# Altium schematic symbol library Capacitor - Ceramic - Sumsung.SchLib: 1421 symbols (part 1 of 8) (continued)
## CL03C6R2BA3GNNC (continued)
CAP CER 6.2PF 25V NP0 0201; Part Number: CL03C6R2BA3GNNC; Manufacturer: Samsung Electro-Mechanics America, Inc.; TemperatureRange: -55C ~ 125C; TemperatureCoefficient: C0G, NP0; Tolerance: 0.1pF; Value: 6.2pF; PartId: 21075; Supplier 1: Digi-Key; Supplier Part Number 1: 1276-1429-2-ND; ComponentLink1Description: Datasheet; ComponentLink1URL: http://www.samsungsem.com/kr/support/product-search/mlcc/__icsFiles/afieldfile/2016/08/18/S_CL03C6R2BA3GNNC.pdf; ComponentLink2Description: Digi-Key Listing; ComponentLink2URL: https://www.digikey.com/product-detail/en/samsung-electro-mechanics-america-inc/CL03C6R2BA3GNNC/1276-1429-2-ND/3887087; Voltage: 25V; Price: 0.0063; Device Package: 0201 (0603 Metric)
footprint CAP 0201/0603
pins: 1, 2

## CL03C6R8BA3GNNC
designator C?, comment 6.8pF
CAP CER 6.8PF 25V NP0 0201; Part Number: CL03C6R8BA3GNNC; Manufacturer: Samsung Electro-Mechanics America, Inc.; TemperatureRange: -55C ~ 125C; TemperatureCoefficient: C0G, NP0; Tolerance: 0.1pF; Value: 6.8pF; PartId: 20809; Supplier 1: Digi-Key; Supplier Part Number 1: 1276-1430-2-ND; ComponentLink1Description: Datasheet; ComponentLink1URL: //media.digikey.com/pdf/Data%20Sheets/Samsung%20PDFs/CL03C6R8BA3GNNC.pdf; ComponentLink2Description: Digi-Key Listing; ComponentLink2URL: https://www.digikey.com/product-detail/en/samsung-electro-mechanics-america-inc/CL03C6R8BA3GNNC/1276-1430-2-ND/3887088; Voltage: 25V; Price: 0.0107; Device Package: 0201 (0603 Metric)
footprint CAP 0201/0603
pins: 1, 2

## CL03C6R8CA3GNNC
designator C?, comment 6.8pF
CAP CER 6.8PF 25V NP0 0201; Part Number: CL03C6R8CA3GNNC; Manufacturer: Samsung Electro-Mechanics America, Inc.; TemperatureRange: -55C ~ 125C; TemperatureCoefficient: C0G, NP0; Tolerance: 0.25pF; Value: 6.8pF; PartId: 20728; Supplier 1: Digi-Key; Supplier Part Number 1: 1276-1431-2-ND; ComponentLink1Description: Datasheet; ComponentLink1URL: http://www.samsungsem.com/kr/support/product-search/mlcc/__icsFiles/afieldfile/2016/08/18/S_CL03C6R8CA3GNNC.pdf; ComponentLink2Description: Digi-Key Listing; ComponentLink2URL: https://www.digikey.com/product-detail/en/samsung-electro-mechanics-america-inc/CL03C6R8CA3GNNC/1276-1431-2-ND/3887089; Voltage: 25V; Price: 0.0039; Device Package: 0201 (0603 Metric)
footprint CAP 0201/0603
pins: 1, 2

## CL03C7R5BA3GNNC
designator C?, comment 7.5pF
CAP CER 7.5PF 25V NP0 0201; Part Number: CL03C7R5BA3GNNC; Manufacturer: Samsung Electro-Mechanics America, Inc.; TemperatureRange: -55C ~ 125C; TemperatureCoefficient: C0G, NP0; Tolerance: 0.1pF; Value: 7.5pF; PartId: 21070; Supplier 1: Digi-Key; Supplier Part Number 1: 1276-1432-2-ND; ComponentLink1Description: Datasheet; ComponentLink1URL: http://www.samsungsem.com/kr/support/product-search/mlcc/__icsFiles/afieldfile/2016/08/18/S_CL03C7R5BA3GNNC.pdf; ComponentLink2Description: Digi-Key Listing; ComponentLink2URL: https://www.digikey.com/product-detail/en/samsung-electro-mechanics-america-inc/CL03C7R5BA3GNNC/1276-1432-2-ND/3887090; Voltage: 25V; Price: 0.0063; Device Package: 0201 (0603 Metric)
footprint CAP 0201/0603
pins: 1, 2

## CL03C7R5CA3GNNC
designator C?, comment 7.5pF
CAP CER 7.5PF 25V NP0 0201; Part Number: CL03C7R5CA3GNNC; Manufacturer: Samsung Electro-Mechanics America, Inc.; TemperatureRange: -55C ~ 125C; TemperatureCoefficient: C0G, NP0; Tolerance: 0.25pF; Value: 7.5pF; PartId: 21056; Supplier 1: Digi-Key; Supplier Part Number 1: 1276-1433-2-ND; ComponentLink1Description: Datasheet; ComponentLink1URL: http://www.samsungsem.com/kr/support/product-search/mlcc/__icsFiles/afieldfile/2016/08/18/S_CL03C7R5CA3GNNC.pdf; ComponentLink2Description: Digi-Key Listing; ComponentLink2URL: https://www.digikey.com/product-detail/en/samsung-electro-mechanics-america-inc/CL03C7R5CA3GNNC/1276-1433-2-ND/3887091; Voltage: 25V; Price: 0.0039; Device Package: 0201 (0603 Metric)
footprint CAP 0201/0603
pins: 1, 2

## CL03C8R2BA3GNNC
designator C?, comment 8.2pF
CAP CER 8.2PF 25V NP0 0201; Part Number: CL03C8R2BA3GNNC; Manufacturer: Samsung Electro-Mechanics America, Inc.; TemperatureRange: -55C ~ 125C; TemperatureCoefficient: C0G, NP0; Tolerance: 0.1pF; Value: 8.2pF; PartId: 21079; Supplier 1: Digi-Key; Supplier Part Number 1: 1276-1435-2-ND; ComponentLink1Description: Datasheet; ComponentLink1URL: //media.digikey.com/pdf/Data%20Sheets/Samsung%20PDFs/CL03C8R2BA3GNNC.pdf; ComponentLink2Description: Digi-Key Listing; ComponentLink2URL: https://www.digikey.com/product-detail/en/samsung-electro-mechanics-america-inc/CL03C8R2BA3GNNC/1276-1435-2-ND/3887093; Voltage: 25V; Price: 0.0063; Device Package: 0201 (0603 Metric)
footprint CAP 0201/0603
pins: 1, 2

## CL03C8R2CA3GNNC
designator C?, comment 8.2pF
CAP CER 8.2PF 25V NP0 0201; Part Number: CL03C8R2CA3GNNC; Manufacturer: Samsung Electro-Mechanics America, Inc.; TemperatureRange: -55C ~ 125C; TemperatureCoefficient: C0G, NP0; Tolerance: 0.25pF; Value: 8.2pF; PartId: 21072; Supplier 1: Digi-Key; Supplier Part Number 1: 1276-1436-2-ND; ComponentLink1Description: Datasheet; ComponentLink1URL: http://www.samsungsem.com/kr/support/product-search/mlcc/__icsFiles/afieldfile/2016/08/18/S_CL03C8R2CA3GNNC.pdf; ComponentLink2Description: Digi-Key Listing; ComponentLink2URL: https://www.digikey.com/product-detail/en/samsung-electro-mechanics-america-inc/CL03C8R2CA3GNNC/1276-1436-2-ND/3887094; Voltage: 25V; Price: 0.0039; Device Package: 0201 (0603 Metric)
footprint CAP 0201/0603
pins: 1, 2

## CL03C9R1BA3GNNC
designator C?, comment 9.1pF
CAP CER 9.1PF 25V NP0 0201; Part Number: CL03C9R1BA3GNNC; Manufacturer: Samsung Electro-Mechanics America, Inc.; TemperatureRange: -55C ~ 125C; TemperatureCoefficient: C0G, NP0; Tolerance: 0.1pF; Value: 9.1pF; PartId: 21067; Supplier 1: Digi-Key; Supplier Part Number 1: 1276-1437-2-ND; ComponentLink1Description: Datasheet; ComponentLink1URL: //media.digikey.com/pdf/Data%20Sheets/Samsung%20PDFs/CL03C9R1BA3GNNC_Spec.pdf; ComponentLink2Description: Digi-Key Listing; ComponentLink2URL: https://www.digikey.com/product-detail/en/samsung-electro-mechanics-america-inc/CL03C9R1BA3GNNC/1276-1437-2-ND/3887095; Voltage: 25V; Price: 0.0063; Device Package: 0201 (0603 Metric)
footprint CAP 0201/0603
pins: 1, 2

## CL03C9R1CA3GNNC
designator C?, comment 9.1pF
CAP CER 9.1PF 25V NP0 0201; Part Number: CL03C9R1CA3GNNC; Manufacturer: Samsung Electro-Mechanics America, Inc.; TemperatureRange: -55C ~ 125C; TemperatureCoefficient: C0G, NP0; Tolerance: 0.25pF; Value: 9.1pF; PartId: 21048; Supplier 1: Digi-Key; Supplier Part Number 1: 1276-1438-2-ND; ComponentLink1Description: Datasheet; ComponentLink1URL: http://www.samsungsem.com/kr/support/product-search/mlcc/__icsFiles/afieldfile/2016/08/18/S_CL03C9R1CA3GNNC.pdf; ComponentLink2Description: Digi-Key Listing; ComponentLink2URL: https://www.digikey.com/product-detail/en/samsung-electro-mechanics-america-inc/CL03C9R1CA3GNNC/1276-1438-2-ND/3887096; Voltage: 25V; Price: 0.0033; Device Package: 0201 (0603 Metric)
footprint CAP 0201/0603
pins: 1, 2

## CL03C010BA3GNNC
designator C?, comment 1pF
CAP CER 1PF 25V C0G/NP0 0201; Part Number: CL03C010BA3GNNC; Manufacturer: Samsung Electro-Mechanics; TemperatureRange: -55C ~ 125C; TemperatureCoefficient: C0G, NP0; Tolerance: 0.1pF; Value: 1pF; PartId: 30157; Supplier 1: Digi-Key; Supplier Part Number 1: 1276-1361-2-ND; ComponentLink1Description: Datasheet; ComponentLink1URL: http://www.samsungsem.com/kr/support/product-search/mlcc/CL03C010BA3GNNC.jsp; ComponentLink2Description: Digi-Key Listing; ComponentLink2URL: https://www.digikey.com/product-detail/en/samsung-electro-mechanics/CL03C010BA3GNNC/1276-1361-2-ND/3887019; Voltage: 25V; Price: 0; Device Package: 0201 (0603 Metric)
footprint CAP 0201/0603
pins: 1, 2

## CL03C010CA3GNNC
designator C?, comment 1pF
CAP CER 1PF 25V NP0 0201; Part Number: CL03C010CA3GNNC; Manufacturer: Samsung Electro-Mechanics America, Inc.; TemperatureRange: -55C ~ 125C; TemperatureCoefficient: C0G, NP0; Tolerance: 0.25pF; Value: 1pF; PartId: 21030; Supplier 1: Digi-Key; Supplier Part Number 1: 1276-1362-2-ND; ComponentLink1Description: Datasheet; ComponentLink1URL: http://www.samsungsem.com/kr/support/product-search/mlcc/__icsFiles/afieldfile/2016/08/18/S_CL03C010CA3GNNC.pdf; ComponentLink2Description: Digi-Key Listing; ComponentLink2URL: https://www.digikey.com/product-detail/en/samsung-electro-mechanics-america-inc/CL03C010CA3GNNC/1276-1362-2-ND/3887020; Voltage: 25V; Price: 0.0039; Device Package: 0201 (0603 Metric)
footprint CAP 0201/0603
pins: 1, 2

## CL03C020BA3GNNC
designator C?, comment 2pF
CAP CER 2PF 25V NP0 0201; Part Number: CL03C020BA3GNNC; Manufacturer: Samsung Electro-Mechanics America, Inc.; TemperatureRange: -55C ~ 125C; TemperatureCoefficient: C0G, NP0; Tolerance: 0.1pF; Value: 2pF; PartId: 20785; Supplier 1: Digi-Key; Supplier Part Number 1: 1276-1363-2-ND; ComponentLink1Description: Datasheet; ComponentLink1URL: http://www.samsungsem.com/kr/support/product-search/mlcc/__icsFiles/afieldfile/2016/08/18/S_CL03C020BA3GNNC.pdf; ComponentLink2Description: Digi-Key Listing; ComponentLink2URL: https://www.digikey.com/product-detail/en/samsung-electro-mechanics-america-inc/CL03C020BA3GNNC/1276-1363-2-ND/3887021; Voltage: 25V; Price: 0.0063; Device Package: 0201 (0603 Metric)
footprint CAP 0201/0603
pins: 1, 2

## CL03C020CA3GNNC
designator C?, comment 2pF
CAP CER 2PF 25V NP0 0201; Part Number: CL03C020CA3GNNC; Manufacturer: Samsung Electro-Mechanics America, Inc.; TemperatureRange: -55C ~ 125C; TemperatureCoefficient: C0G, NP0; Tolerance: 0.25pF; Value: 2pF; PartId: 21046; Supplier 1: Digi-Key; Supplier Part Number 1: 1276-1364-2-ND; ComponentLink1Description: Datasheet; ComponentLink1URL: http://www.samsungsem.com/kr/support/product-search/mlcc/__icsFiles/afieldfile/2016/08/18/S_CL03C020CA3GNNC.pdf; ComponentLink2Description: Digi-Key Listing; ComponentLink2URL: https://www.digikey.com/product-detail/en/samsung-electro-mechanics-america-inc/CL03C020CA3GNNC/1276-1364-2-ND/3887022; Voltage: 25V; Price: 0.0039; Device Package: 0201 (0603 Metric)
footprint CAP 0201/0603
pins: 1, 2

## CL03C030BA3GNNC
designator C?, comment 3pF
CAP CER 3PF 25V NP0 0201; Part Number: CL03C030BA3GNNC; Manufacturer: Samsung Electro-Mechanics America, Inc.; TemperatureRange: -55C ~ 125C; TemperatureCoefficient: C0G, NP0; Tolerance: 0.1pF; Value: 3pF; PartId: 21058; Supplier 1: Digi-Key; Supplier Part Number 1: 1276-1365-2-ND; ComponentLink1Description: Datasheet; ComponentLink1URL: http://www.samsungsem.com/kr/support/product-search/mlcc/__icsFiles/afieldfile/2016/08/18/S_CL03C030BA3GNNC.pdf; ComponentLink2Description: Digi-Key Listing; ComponentLink2URL: https://www.digikey.com/product-detail/en/samsung-electro-mechanics-america-inc/CL03C030BA3GNNC/1276-1365-2-ND/3887023; Voltage: 25V; Price: 0.0063; Device Package: 0201 (0603 Metric)
footprint CAP 0201/0603
pins: 1, 2

## CL03C030CA3GNNC
designator C?, comment 3pF
CAP CER 3PF 25V NP0 0201; Part Number: CL03C030CA3GNNC; Manufacturer: Samsung Electro-Mechanics America, Inc.; TemperatureRange: -55C ~ 125C; TemperatureCoefficient: C0G, NP0; Tolerance: 0.25pF; Value: 3pF; PartId: 20732; Supplier 1: Digi-Key; Supplier Part Number 1: 1276-1366-2-ND; ComponentLink1Description: Datasheet; ComponentLink1URL: http://www.samsungsem.com/kr/support/product-search/mlcc/__icsFiles/afieldfile/2016/08/18/S_CL03C030CA3GNNC.pdf; ComponentLink2Description: Digi-Key Listing; ComponentLink2URL: https://www.digikey.com/product-detail/en/samsung-electro-mechanics-america-inc/CL03C030CA3GNNC/1276-1366-2-ND/3887024; Voltage: 25V; Price: 0.0039; Device Package: 0201 (0603 Metric)
footprint CAP 0201/0603
pins: 1, 2

## CL03C030CB3GNNC
designator C?, comment 3pF
CAP CER 3PF 50V NP0 0201; Part Number: CL03C030CB3GNNC; Manufacturer: Samsung Electro-Mechanics America, Inc.; TemperatureRange: -55C ~ 125C; TemperatureCoefficient: C0G, NP0; Tolerance: 0.25pF; Value: 3pF; PartId: 20770; Supplier 1: Digi-Key; Supplier Part Number 1: 1276-1367-2-ND; ComponentLink1Description: Datasheet; ComponentLink1URL: http://www.samsungsem.com/kr/support/product-search/mlcc/__icsFiles/afieldfile/2016/08/18/S_CL03C030CB3GNNC.pdf; ComponentLink2Description: Digi-Key Listing; ComponentLink2URL: https://www.digikey.com/product-detail/en/samsung-electro-mechanics-america-inc/CL03C030CB3GNNC/1276-1367-2-ND/3887025; Voltage: 50V; Price: 0.0046; Device Package: 0201 (0603 Metric)
footprint CAP 0201/0603
pins: 1, 2

## CL03C050BA3GNNC
designator C?, comment 5pF
CAP CER 5PF 25V NP0 0201; Part Number: CL03C050BA3GNNC; Manufacturer: Samsung Electro-Mechanics America, Inc.; TemperatureRange: -55C ~ 125C; TemperatureCoefficient: C0G, NP0; Tolerance: 0.1pF; Value: 5pF; PartId: 21033; Supplier 1: Digi-Key; Supplier Part Number 1: 1276-6560-2-ND; ComponentLink1Description: Datasheet; ComponentLink1URL: //media.digikey.com/pdf/Data%20Sheets/Samsung%20PDFs/CL_Series_MLCC_ds.pdf; ComponentLink2Description: Digi-Key Listing; ComponentLink2URL: https://www.digikey.com/product-detail/en/samsung-electro-mechanics-america-inc/CL03C050BA3GNNC/1276-6560-2-ND/5961044; Voltage: 25V; Price: 0.0033; Device Package: 0201 (0603 Metric)
footprint CAP 0201/0603
pins: 1, 2

## CL03C050CA3GNNC
designator C?, comment 5pF
CAP CER 5PF 25V NP0 0201; Part Number: CL03C050CA3GNNC; Manufacturer: Samsung Electro-Mechanics America, Inc.; TemperatureRange: -55C ~ 125C; TemperatureCoefficient: C0G, NP0; Tolerance: 0.25pF; Value: 5pF; PartId: 21059; Supplier 1: Digi-Key; Supplier Part Number 1: 1276-1368-2-ND; ComponentLink1Description: Datasheet; ComponentLink1URL: http://www.samsungsem.com/kr/support/product-search/mlcc/__icsFiles/afieldfile/2016/08/18/S_CL03C050CA3GNNC.pdf; ComponentLink2Description: Digi-Key Listing; ComponentLink2URL: https://www.digikey.com/product-detail/en/samsung-electro-mechanics-america-inc/CL03C050CA3GNNC/1276-1368-2-ND/3887026; Voltage: 25V; Price: 0.0039; Device Package: 0201 (0603 Metric)
footprint CAP 0201/0603
pins: 1, 2

## CL03C060BA3GNNC
designator C?, comment 6pF
CAP CER 6PF 25V NP0 0201; Part Number: CL03C060BA3GNNC; Manufacturer: Samsung Electro-Mechanics America, Inc.; TemperatureRange: -55C ~ 125C; TemperatureCoefficient: C0G, NP0; Tolerance: 0.1pF; Value: 6pF; PartId: 21085; Supplier 1: Digi-Key; Supplier Part Number 1: 1276-1369-2-ND; ComponentLink1Description: Datasheet; ComponentLink1URL: http://www.samsungsem.com/kr/support/product-search/mlcc/__icsFiles/afieldfile/2016/08/18/S_CL03C060BA3GNNC.pdf; ComponentLink2Description: Digi-Key Listing; ComponentLink2URL: https://www.digikey.com/product-detail/en/samsung-electro-mechanics-america-inc/CL03C060BA3GNNC/1276-1369-2-ND/3887027; Voltage: 25V; Price: 0.0063; Device Package: 0201 (0603 Metric)
footprint CAP 0201/0603
pins: 1, 2

## CL03C060CA3GNNC
designator C?, comment 6pF
CAP CER 6PF 25V NP0 0201; Part Number: CL03C060CA3GNNC; Manufacturer: Samsung Electro-Mechanics America, Inc.; TemperatureRange: -55C ~ 125C; TemperatureCoefficient: C0G, NP0; Tolerance: 0.25pF; Value: 6pF; PartId: 21037; Supplier 1: Digi-Key; Supplier Part Number 1: 1276-6710-2-ND; ComponentLink1Description: Datasheet; ComponentLink1URL: http://www.samsungsem.com/kr/support/product-search/mlcc/__icsFiles/afieldfile/2016/08/18/S_CL03C060CA3GNNC.pdf; ComponentLink2Description: Digi-Key Listing; ComponentLink2URL: https://www.digikey.com/product-detail/en/samsung-electro-mechanics-america-inc/CL03C060CA3GNNC/1276-6710-2-ND/5961194; Voltage: 25V; Price: 0.0086; Device Package: 0201 (0603 Metric)
footprint CAP 0201/0603
pins: 1, 2

## CL03C060DA3GNNC
designator C?, comment 6pF
CAP CER 6PF 25V NP0 0201; Part Number: CL03C060DA3GNNC; Manufacturer: Samsung Electro-Mechanics America, Inc.; TemperatureRange: -55C ~ 125C; TemperatureCoefficient: C0G, NP0; Tolerance: 0.5pF; Value: 6pF; PartId: 21043; Supplier 1: Digi-Key; Supplier Part Number 1: 1276-1370-2-ND; ComponentLink1Description: Datasheet; ComponentLink1URL: http://www.samsungsem.com/kr/support/product-search/mlcc/__icsFiles/afieldfile/2016/08/18/S_CL03C060DA3GNNC.pdf; ComponentLink2Description: Digi-Key Listing; ComponentLink2URL: https://www.digikey.com/product-detail/en/samsung-electro-mechanics-america-inc/CL03C060DA3GNNC/1276-1370-2-ND/3887028; Voltage: 25V; Price: 0.0042; Device Package: 0201 (0603 Metric)
footprint CAP 0201/0603
pins: 1, 2

## CL03C070BA3GNNC
designator C?, comment 7pF
CAP CER 7PF 25V NP0 0201; Part Number: CL03C070BA3GNNC; Manufacturer: Samsung Electro-Mechanics America, Inc.; TemperatureRange: -55C ~ 125C; TemperatureCoefficient: C0G, NP0; Tolerance: 0.1pF; Value: 7pF; PartId: 20987; Supplier 1: Digi-Key; Supplier Part Number 1: 1276-6707-2-ND; ComponentLink1Description: Datasheet; ComponentLink1URL: http://www.samsungsem.com/kr/support/product-search/mlcc/__icsFiles/afieldfile/2016/08/18/S_CL03C070BA3GNNC.pdf; ComponentLink2Description: Digi-Key Listing; ComponentLink2URL: https://www.digikey.com/product-detail/en/samsung-electro-mechanics-america-inc/CL03C070BA3GNNC/1276-6707-2-ND/5961191; Voltage: 25V; Price: 0.0033; Device Package: 0201 (0603 Metric)
footprint CAP 0201/0603
pins: 1, 2

## CL03C080DA3GNNC
designator C?, comment 8pF
CAP CER 8PF 25V C0G/NP0 0201; Part Number: CL03C080DA3GNNC; Manufacturer: Samsung Electro-Mechanics; TemperatureRange: -55C ~ 125C; TemperatureCoefficient: C0G, NP0; Tolerance: 0.5pF; Value: 8pF; PartId: 30159; Supplier 1: Digi-Key; Supplier Part Number 1: 1276-1371-2-ND; ComponentLink1Description: Datasheet; ComponentLink1URL: http://www.samsungsem.com/kr/support/product-search/mlcc/CL03C080DA3GNNC.jsp; ComponentLink2Description: Digi-Key Listing; ComponentLink2URL: https://www.digikey.com/product-detail/en/samsung-electro-mechanics/CL03C080DA3GNNC/1276-1371-2-ND/3887029; Voltage: 25V; Price: 0; Device Package: 0201 (0603 Metric)
footprint CAP 0201/0603
pins: 1, 2

## CL03C090CA3GNNC
designator C?, comment 9pF
CAP CER 9PF 25V C0G/NP0 0201; Part Number: CL03C090CA3GNNC; Manufacturer: Samsung Electro-Mechanics; TemperatureRange: -55C ~ 125C; TemperatureCoefficient: C0G, NP0; Tolerance: 0.25pF; Value: 9pF; PartId: 30135; Supplier 1: Digi-Key; Supplier Part Number 1: 1276-1372-2-ND; ComponentLink1Description: Datasheet; ComponentLink1URL: http://www.samsungsem.com/kr/support/product-search/mlcc/CL03C090CA3GNNC.jsp; ComponentLink2Description: Digi-Key Listing; ComponentLink2URL: https://www.digikey.com/product-detail/en/samsung-electro-mechanics/CL03C090CA3GNNC/1276-1372-2-ND/3887030; Voltage: 25V; Price: 0; Device Package: 0201 (0603 Metric)
footprint CAP 0201/0603
pins: 1, 2

## CL03C090DA3GNNC
designator C?, comment 9pF
CAP CER 9PF 25V NP0 0201; Part Number: CL03C090DA3GNNC; Manufacturer: Samsung Electro-Mechanics America, Inc.; TemperatureRange: -55C ~ 125C; TemperatureCoefficient: C0G, NP0; Tolerance: 0.5pF; Value: 9pF; PartId: 21062; Supplier 1: Digi-Key; Supplier Part Number 1: 1276-1373-2-ND; ComponentLink1Description: Datasheet; ComponentLink1URL: http://www.samsungsem.com/kr/support/product-search/mlcc/__icsFiles/afieldfile/2016/08/18/S_CL03C090DA3GNNC.pdf; ComponentLink2Description: Digi-Key Listing; ComponentLink2URL: https://www.digikey.com/product-detail/en/samsung-electro-mechanics-america-inc/CL03C090DA3GNNC/1276-1373-2-ND/3887031; Voltage: 25V; Price: 0.0042; Device Package: 0201 (0603 Metric)
footprint CAP 0201/0603
pins: 1, 2

## CL03C100DA3GNNC
designator C?, comment 10pF
CAP CER 10PF 25V NP0 0201; Part Number: CL03C100DA3GNNC; Manufacturer: Samsung Electro-Mechanics America, Inc.; TemperatureRange: -55C ~ 125C; TemperatureCoefficient: C0G, NP0; Tolerance: 0.5pF; Value: 10pF; PartId: 21074; Supplier 1: Digi-Key; Supplier Part Number 1: 1276-1383-2-ND; ComponentLink1Description: Datasheet; ComponentLink1URL: http://www.samsungsem.com/kr/front/downloadcms.do?path=/kr/support/product-search/mlcc/__icsFiles/afieldfile/2014/11/05&fileName=C_CL03C100DA3GNNC.pdf; ComponentLink2Description: Digi-Key Listing; ComponentLink2URL: https://www.digikey.com/product-detail/en/samsung-electro-mechanics-america-inc/CL03C100DA3GNNC/1276-1383-2-ND/3887041; Voltage: 25V; Price: 0.0039; Device Package: 0201 (0603 Metric)
footprint CAP 0201/0603
pins: 1, 2

## CL03C100JA3GNNC
designator C?, comment 10pF
CAP CER 10PF 25V NP0 0201; Part Number: CL03C100JA3GNNC; Manufacturer: Samsung Electro-Mechanics America, Inc.; TemperatureRange: -55C ~ 125C; TemperatureCoefficient: C0G, NP0; Tolerance: 5%; Value: 10pF; PartId: 20556; Supplier 1: Digi-Key; Supplier Part Number 1: 1276-1384-2-ND; ComponentLink1Description: Datasheet; ComponentLink1URL: http://www.samsungsem.com/kr/support/product-search/mlcc/__icsFiles/afieldfile/2016/08/18/S_CL03C100JA3GNNC.pdf; ComponentLink2Description: Digi-Key Listing; ComponentLink2URL: https://www.digikey.com/product-detail/en/samsung-electro-mechanics-america-inc/CL03C100JA3GNNC/1276-1384-2-ND/3887042; Voltage: 25V; Price: 0.0029; Device Package: 0201 (0603 Metric)
footprint CAP 0201/0603
pins: 1, 2

## CL03C101JB3NNNC
designator C?, comment 100pF
CAP CER 100PF 50V NP0 0201; Part Number: CL03C101JB3NNNC; Manufacturer: Samsung Electro-Mechanics America, Inc.; TemperatureRange: -55C ~ 125C; TemperatureCoefficient: C0G, NP0; Tolerance: 5%; Value: 100pF; PartId: 21092; Supplier 1: Digi-Key; Supplier Part Number 1: 1276-6758-2-ND; ComponentLink1Description: Datasheet; ComponentLink1URL: //media.digikey.com/pdf/Data%20Sheets/Samsung%20PDFs/CL_Series_MLCC_ds.pdf; ComponentLink2Description: Digi-Key Listing; ComponentLink2URL: https://www.digikey.com/product-detail/en/samsung-electro-mechanics-america-inc/CL03C101JB3NNNC/1276-6758-2-ND/5961242; Voltage: 50V; Price: 0.0149; Device Package: 0201 (0603 Metric)
footprint CAP 0201/0603
pins: 1, 2

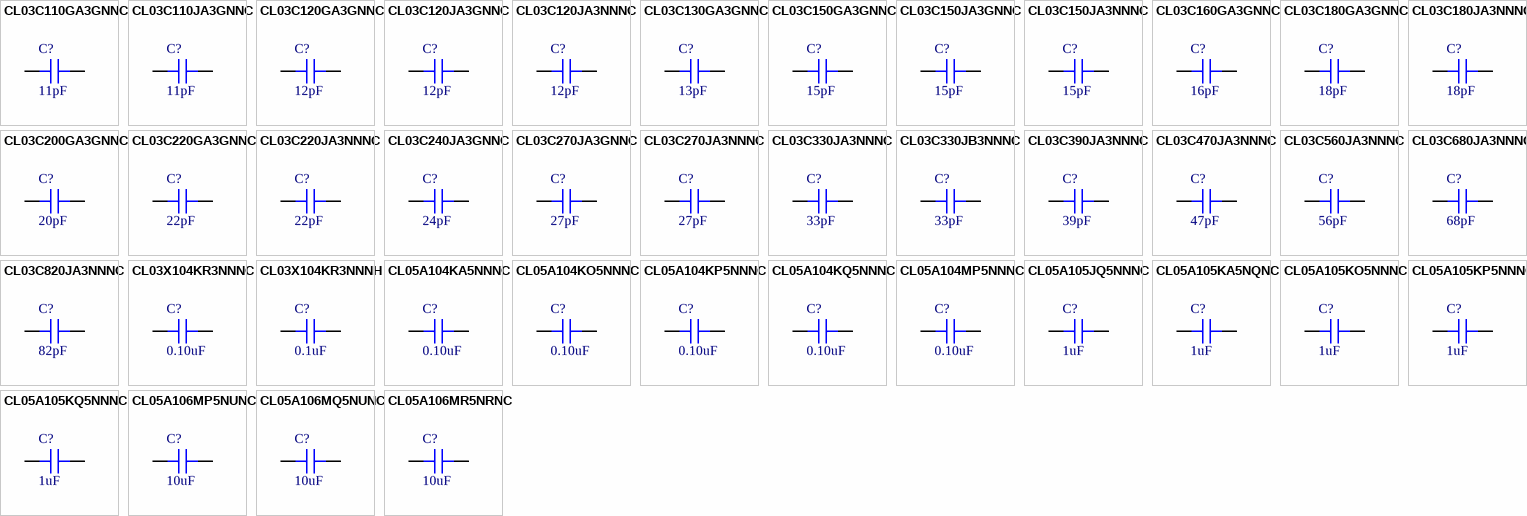
[diagram p3: symbols CL03C110GA3GNNC to CL05A106MR5NRNC]

## CL03C110GA3GNNC
designator C?, comment 11pF
CAP CER 11PF 25V NP0 0201; Part Number: CL03C110GA3GNNC; Manufacturer: Samsung Electro-Mechanics America, Inc.; TemperatureRange: -55C ~ 125C; TemperatureCoefficient: C0G, NP0; Tolerance: 2%; Value: 11pF; PartId: 21093; Supplier 1: Digi-Key; Supplier Part Number 1: 1276-6748-2-ND; ComponentLink1Description: Datasheet; ComponentLink1URL: http://www.samsungsem.com/kr/support/product-search/mlcc/__icsFiles/afieldfile/2016/08/18/S_CL03C110GA3GNNC.pdf; ComponentLink2Description: Digi-Key Listing; ComponentLink2URL: https://www.digikey.com/product-detail/en/samsung-electro-mechanics-america-inc/CL03C110GA3GNNC/1276-6748-2-ND/5961232; Voltage: 25V; Price: 0.0153; Device Package: 0201 (0603 Metric)
footprint CAP 0201/0603
pins: 1, 2

## CL03C110JA3GNNC
designator C?, comment 11pF
CAP CER 11PF 25V NP0 0201; Part Number: CL03C110JA3GNNC; Manufacturer: Samsung Electro-Mechanics America, Inc.; TemperatureRange: -55C ~ 125C; TemperatureCoefficient: C0G, NP0; Tolerance: 5%; Value: 11pF; PartId: 21087; Supplier 1: Digi-Key; Supplier Part Number 1: 1276-1386-2-ND; ComponentLink1Description: Datasheet; ComponentLink1URL: http://www.samsungsem.com/kr/front/downloadcms.do?path=/kr/support/product-search/mlcc/__icsFiles/afieldfile/2014/11/05&fileName=C_CL03C110JA3GNNC.pdf; ComponentLink2Description: Digi-Key Listing; ComponentLink2URL: https://www.digikey.com/product-detail/en/samsung-electro-mechanics-america-inc/CL03C110JA3GNNC/1276-1386-2-ND/3887044; Voltage: 25V; Price: 0.0029; Device Package: 0201 (0603 Metric)
footprint CAP 0201/0603
pins: 1, 2

## CL03C120GA3GNNC
designator C?, comment 12pF
CAP CER 12PF 25V C0G/NP0 0201; Part Number: CL03C120GA3GNNC; Manufacturer: Samsung Electro-Mechanics; TemperatureRange: -55C ~ 125C; TemperatureCoefficient: C0G, NP0; Tolerance: 2%; Value: 12pF; PartId: 30173; Supplier 1: Digi-Key; Supplier Part Number 1: 1276-6741-2-ND; ComponentLink1Description: Datasheet; ComponentLink1URL: http://www.samsungsem.com/kr/support/product-search/mlcc/CL03C120GA3GNNC.jsp; ComponentLink2Description: Digi-Key Listing; ComponentLink2URL: https://www.digikey.com/product-detail/en/samsung-electro-mechanics/CL03C120GA3GNNC/1276-6741-2-ND/5961225; Voltage: 25V; Price: 0; Device Package: 0201 (0603 Metric)
footprint CAP 0201/0603
pins: 1, 2

## CL03C120JA3GNNC
designator C?, comment 12pF
CAP CER 12PF 25V NP0 0201; Part Number: CL03C120JA3GNNC; Manufacturer: Samsung Electro-Mechanics America, Inc.; TemperatureRange: -55C ~ 125C; TemperatureCoefficient: C0G, NP0; Tolerance: 5%; Value: 12pF; PartId: 20568; Supplier 1: Digi-Key; Supplier Part Number 1: 1276-1388-2-ND; ComponentLink1Description: Datasheet; ComponentLink1URL: http://www.samsungsem.com/kr/front/downloadcms.do?path=/kr/support/product-search/mlcc/__icsFiles/afieldfile/2014/11/05&fileName=C_CL03C120JA3GNNC.pdf; ComponentLink2Description: Digi-Key Listing; ComponentLink2URL: https://www.digikey.com/product-detail/en/samsung-electro-mechanics-america-inc/CL03C120JA3GNNC/1276-1388-2-ND/3887046; Voltage: 25V; Price: 0.0033; Device Package: 0201 (0603 Metric)
footprint CAP 0201/0603
pins: 1, 2

## CL03C120JA3NNNC
designator C?, comment 12pF
CAP CER 12PF 25V NP0 0201; Part Number: CL03C120JA3NNNC; Manufacturer: Samsung Electro-Mechanics America, Inc.; TemperatureRange: -55C ~ 125C; TemperatureCoefficient: C0G, NP0; Tolerance: 5%; Value: 12pF; PartId: 21039; Supplier 1: Digi-Key; Supplier Part Number 1: 1276-6400-2-ND; ComponentLink1Description: Datasheet; ComponentLink1URL: http://www.samsungsem.com/kr/support/product-search/mlcc/__icsFiles/afieldfile/2016/08/18/S_CL03C120JA3NNNC.pdf; ComponentLink2Description: Digi-Key Listing; ComponentLink2URL: https://www.digikey.com/product-detail/en/samsung-electro-mechanics-america-inc/CL03C120JA3NNNC/1276-6400-2-ND/5180494; Voltage: 25V; Price: 0.0039; Device Package: 0201 (0603 Metric)
footprint CAP 0201/0603
pins: 1, 2

## CL03C130GA3GNNC
designator C?, comment 13pF
CAP CER 13PF 25V NP0 0201; Part Number: CL03C130GA3GNNC; Manufacturer: Samsung Electro-Mechanics America, Inc.; TemperatureRange: -55C ~ 125C; TemperatureCoefficient: C0G, NP0; Tolerance: 2%; Value: 13pF; PartId: 21088; Supplier 1: Digi-Key; Supplier Part Number 1: 1276-6742-2-ND; ComponentLink1Description: Datasheet; ComponentLink1URL: http://www.samsungsem.com/kr/support/product-search/mlcc/__icsFiles/afieldfile/2016/08/18/S_CL03C130GA3GNNC.pdf; ComponentLink2Description: Digi-Key Listing; ComponentLink2URL: https://www.digikey.com/product-detail/en/samsung-electro-mechanics-america-inc/CL03C130GA3GNNC/1276-6742-2-ND/5961226; Voltage: 25V; Price: 0.0153; Device Package: 0201 (0603 Metric)
footprint CAP 0201/0603
pins: 1, 2

## CL03C150GA3GNNC
designator C?, comment 15pF
CAP CER 15PF 25V NP0 0201; Part Number: CL03C150GA3GNNC; Manufacturer: Samsung Electro-Mechanics America, Inc.; TemperatureRange: -55C ~ 125C; TemperatureCoefficient: C0G, NP0; Tolerance: 2%; Value: 15pF; PartId: 21089; Supplier 1: Digi-Key; Supplier Part Number 1: 1276-6744-2-ND; ComponentLink1Description: Datasheet; ComponentLink1URL: http://www.samsungsem.com/kr/support/product-search/mlcc/__icsFiles/afieldfile/2016/08/18/S_CL03C150GA3GNNC.pdf; ComponentLink2Description: Digi-Key Listing; ComponentLink2URL: https://www.digikey.com/product-detail/en/samsung-electro-mechanics-america-inc/CL03C150GA3GNNC/1276-6744-2-ND/5961228; Voltage: 25V; Price: 0.0153; Device Package: 0201 (0603 Metric)
footprint CAP 0201/0603
pins: 1, 2

## CL03C150JA3GNNC
designator C?, comment 15pF
CAP CER 15PF 25V C0G/NP0 0201; Part Number: CL03C150JA3GNNC; Manufacturer: Samsung Electro-Mechanics; TemperatureRange: -55C ~ 125C; TemperatureCoefficient: C0G, NP0; Tolerance: 5%; Value: 15pF; PartId: 30140; Supplier 1: Digi-Key; Supplier Part Number 1: 1276-6573-2-ND; ComponentLink1Description: Datasheet; ComponentLink1URL: http://www.samsungsem.com/kr/support/product-search/mlcc/CL03C150JA3GNNC.jsp; ComponentLink2Description: Digi-Key Listing; ComponentLink2URL: https://www.digikey.com/product-detail/en/samsung-electro-mechanics/CL03C150JA3GNNC/1276-6573-2-ND/5961057; Voltage: 25V; Price: 0; Device Package: 0201 (0603 Metric)
footprint CAP 0201/0603
pins: 1, 2

## CL03C150JA3NNNC
designator C?, comment 15pF
CAP CER 15PF 25V NP0 0201; Part Number: CL03C150JA3NNNC; Manufacturer: Samsung Electro-Mechanics America, Inc.; TemperatureRange: -55C ~ 125C; TemperatureCoefficient: C0G, NP0; Tolerance: 5%; Value: 15pF; PartId: 20735; Supplier 1: Digi-Key; Supplier Part Number 1: 1276-6401-2-ND; ComponentLink1Description: Datasheet; ComponentLink1URL: http://www.samsungsem.com/kr/support/product-search/mlcc/__icsFiles/afieldfile/2016/08/18/S_CL03C150JA3NNNC.pdf; ComponentLink2Description: Digi-Key Listing; ComponentLink2URL: https://www.digikey.com/product-detail/en/samsung-electro-mechanics-america-inc/CL03C150JA3NNNC/1276-6401-2-ND/5180495; Voltage: 25V; Price: 0.0039; Device Package: 0201 (0603 Metric)
footprint CAP 0201/0603
pins: 1, 2

## CL03C160GA3GNNC
designator C?, comment 16pF
CAP CER 16PF 25V NP0 0201; Part Number: CL03C160GA3GNNC; Manufacturer: Samsung Electro-Mechanics America, Inc.; TemperatureRange: -55C ~ 125C; TemperatureCoefficient: C0G, NP0; Tolerance: 2%; Value: 16pF; PartId: 21091; Supplier 1: Digi-Key; Supplier Part Number 1: 1276-6749-2-ND; ComponentLink1Description: Datasheet; ComponentLink1URL: //media.digikey.com/pdf/Data%20Sheets/Samsung%20PDFs/CL03C160GA3GNNC_Spec.pdf; ComponentLink2Description: Digi-Key Listing; ComponentLink2URL: https://www.digikey.com/product-detail/en/samsung-electro-mechanics-america-inc/CL03C160GA3GNNC/1276-6749-2-ND/5961233; Voltage: 25V; Price: 0.0153; Device Package: 0201 (0603 Metric)
footprint CAP 0201/0603
pins: 1, 2

## CL03C180GA3GNNC
designator C?, comment 18pF
CAP CER 18PF 25V NP0 0201; Part Number: CL03C180GA3GNNC; Manufacturer: Samsung Electro-Mechanics America, Inc.; TemperatureRange: -55C ~ 125C; TemperatureCoefficient: C0G, NP0; Tolerance: 2%; Value: 18pF; PartId: 21019; Supplier 1: Digi-Key; Supplier Part Number 1: 1276-6791-2-ND; ComponentLink1Description: Datasheet; ComponentLink1URL: http://www.samsungsem.com/kr/support/product-search/mlcc/__icsFiles/afieldfile/2016/08/18/S_CL03C180GA3GNNC.pdf; ComponentLink2Description: Digi-Key Listing; ComponentLink2URL: https://www.digikey.com/product-detail/en/samsung-electro-mechanics-america-inc/CL03C180GA3GNNC/1276-6791-2-ND/5961275; Voltage: 25V; Price: 0.0236; Device Package: 0201 (0603 Metric)
footprint CAP 0201/0603
pins: 1, 2

## CL03C180JA3NNNC
designator C?, comment 18pF
CAP CER 18PF 25V NP0 0201; Part Number: CL03C180JA3NNNC; Manufacturer: Samsung Electro-Mechanics America, Inc.; TemperatureRange: -55C ~ 125C; TemperatureCoefficient: C0G, NP0; Tolerance: 5%; Value: 18pF; PartId: 20731; Supplier 1: Digi-Key; Supplier Part Number 1: 1276-6402-2-ND; ComponentLink1Description: Datasheet; ComponentLink1URL: http://www.samsungsem.com/kr/support/product-search/mlcc/__icsFiles/afieldfile/2016/08/18/S_CL03C180JA3NNNC.pdf; ComponentLink2Description: Digi-Key Listing; ComponentLink2URL: https://www.digikey.com/product-detail/en/samsung-electro-mechanics-america-inc/CL03C180JA3NNNC/1276-6402-2-ND/5180496; Voltage: 25V; Price: 0.0039; Device Package: 0201 (0603 Metric)
footprint CAP 0201/0603
pins: 1, 2

## CL03C200GA3GNNC
designator C?, comment 20pF
CAP CER 20PF 25V NP0 0201; Part Number: CL03C200GA3GNNC; Manufacturer: Samsung Electro-Mechanics America, Inc.; TemperatureRange: -55C ~ 125C; TemperatureCoefficient: C0G, NP0; Tolerance: 2%; Value: 20pF; PartId: 21090; Supplier 1: Digi-Key; Supplier Part Number 1: 1276-6746-2-ND; ComponentLink1Description: Datasheet; ComponentLink1URL: http://www.samsungsem.com/kr/support/product-search/mlcc/__icsFiles/afieldfile/2016/08/18/S_CL03C200GA3GNNC.pdf; ComponentLink2Description: Digi-Key Listing; ComponentLink2URL: https://www.digikey.com/product-detail/en/samsung-electro-mechanics-america-inc/CL03C200GA3GNNC/1276-6746-2-ND/5961230; Voltage: 25V; Price: 0.0153; Device Package: 0201 (0603 Metric)
footprint CAP 0201/0603
pins: 1, 2

## CL03C220GA3GNNC
designator C?, comment 22pF
CAP CER 22PF 25V NP0 0201; Part Number: CL03C220GA3GNNC; Manufacturer: Samsung Electro-Mechanics America, Inc.; TemperatureRange: -55C ~ 125C; TemperatureCoefficient: C0G, NP0; Tolerance: 2%; Value: 22pF; PartId: 21094; Supplier 1: Digi-Key; Supplier Part Number 1: 1276-6747-2-ND; ComponentLink1Description: Datasheet; ComponentLink1URL: http://www.samsungsem.com/kr/support/product-search/mlcc/__icsFiles/afieldfile/2016/08/18/S_CL03C220GA3GNNC.pdf; ComponentLink2Description: Digi-Key Listing; ComponentLink2URL: https://www.digikey.com/product-detail/en/samsung-electro-mechanics-america-inc/CL03C220GA3GNNC/1276-6747-2-ND/5961231; Voltage: 25V; Price: 0.0153; Device Package: 0201 (0603 Metric)
footprint CAP 0201/0603
pins: 1, 2

## CL03C220JA3NNNC
designator C?, comment 22pF
CAP CER 22PF 25V NP0 0201; Part Number: CL03C220JA3NNNC; Manufacturer: Samsung Electro-Mechanics America, Inc.; TemperatureRange: -55C ~ 125C; TemperatureCoefficient: C0G, NP0; Tolerance: 5%; Value: 22pF; PartId: 20729; Supplier 1: Digi-Key; Supplier Part Number 1: 1276-6403-2-ND; ComponentLink1Description: Datasheet; ComponentLink1URL: //media.digikey.com/pdf/Data%20Sheets/Samsung%20PDFs/CL_Series_MLCC_ds.pdf; ComponentLink2Description: Digi-Key Listing; ComponentLink2URL: https://www.digikey.com/product-detail/en/samsung-electro-mechanics-america-inc/CL03C220JA3NNNC/1276-6403-2-ND/5180497; Voltage: 25V; Price: 0.0039; Device Package: 0201 (0603 Metric)
footprint CAP 0201/0603
pins: 1, 2

## CL03C240JA3GNNC
designator C?, comment 24pF
CAP CER 24PF 25V NP0 0201; Part Number: CL03C240JA3GNNC; Manufacturer: Samsung Electro-Mechanics America, Inc.; TemperatureRange: -55C ~ 125C; TemperatureCoefficient: C0G, NP0; Tolerance: 5%; Value: 24pF; PartId: 21034; Supplier 1: Digi-Key; Supplier Part Number 1: 1276-6564-2-ND; ComponentLink1Description: Datasheet; ComponentLink1URL: http://www.samsungsem.com/kr/support/product-search/mlcc/__icsFiles/afieldfile/2016/08/18/S_CL03C240JA3GNNC.pdf; ComponentLink2Description: Digi-Key Listing; ComponentLink2URL: https://www.digikey.com/product-detail/en/samsung-electro-mechanics-america-inc/CL03C240JA3GNNC/1276-6564-2-ND/5961048; Voltage: 25V; Price: 0.0035; Device Package: 0201 (0603 Metric)
footprint CAP 0201/0603
pins: 1, 2

## CL03C270JA3GNNC
designator C?, comment 27pF
CAP CER 27PF 25V NP0 0201; Part Number: CL03C270JA3GNNC; Manufacturer: Samsung Electro-Mechanics America, Inc.; TemperatureRange: -55C ~ 125C; TemperatureCoefficient: C0G, NP0; Tolerance: 5%; Value: 27pF; PartId: 21035; Supplier 1: Digi-Key; Supplier Part Number 1: 1276-6574-2-ND; ComponentLink1Description: Datasheet; ComponentLink1URL: http://www.samsungsem.com/kr/support/product-search/mlcc/__icsFiles/afieldfile/2016/08/18/S_CL03C270JA3GNNC.pdf; ComponentLink2Description: Digi-Key Listing; ComponentLink2URL: https://www.digikey.com/product-detail/en/samsung-electro-mechanics-america-inc/CL03C270JA3GNNC/1276-6574-2-ND/5961058; Voltage: 25V; Price: 0.0037; Device Package: 0201 (0603 Metric)
footprint CAP 0201/0603
pins: 1, 2

## CL03C270JA3NNNC
designator C?, comment 27pF
CAP CER 27PF 25V NP0 0201; Part Number: CL03C270JA3NNNC; Manufacturer: Samsung Electro-Mechanics America, Inc.; TemperatureRange: -55C ~ 125C; TemperatureCoefficient: C0G, NP0; Tolerance: 5%; Value: 27pF; PartId: 21041; Supplier 1: Digi-Key; Supplier Part Number 1: 1276-6404-2-ND; ComponentLink1Description: Datasheet; ComponentLink1URL: http://www.samsungsem.com/kr/support/product-search/mlcc/__icsFiles/afieldfile/2016/08/18/S_CL03C270JA3NNNC.pdf; ComponentLink2Description: Digi-Key Listing; ComponentLink2URL: https://www.digikey.com/product-detail/en/samsung-electro-mechanics-america-inc/CL03C270JA3NNNC/1276-6404-2-ND/5180498; Voltage: 25V; Price: 0.0039; Device Package: 0201 (0603 Metric)
footprint CAP 0201/0603
pins: 1, 2

## CL03C330JA3NNNC
designator C?, comment 33pF
CAP CER 33PF 25V NP0 0201; Part Number: CL03C330JA3NNNC; Manufacturer: Samsung Electro-Mechanics America, Inc.; TemperatureRange: -55C ~ 125C; TemperatureCoefficient: C0G, NP0; Tolerance: 5%; Value: 33pF; PartId: 21082; Supplier 1: Digi-Key; Supplier Part Number 1: 1276-6405-2-ND; ComponentLink1Description: Datasheet; ComponentLink1URL: //media.digikey.com/pdf/Data%20Sheets/Samsung%20PDFs/MLCC_Catalog_2015.pdf; ComponentLink2Description: Digi-Key Listing; ComponentLink2URL: https://www.digikey.com/product-detail/en/samsung-electro-mechanics-america-inc/CL03C330JA3NNNC/1276-6405-2-ND/5180499; Voltage: 25V; Price: 0.0039; Device Package: 0201 (0603 Metric)
footprint CAP 0201/0603
pins: 1, 2

## CL03C330JB3NNNC
designator C?, comment 33pF
CAP CER 33PF 50V NP0 0201; Part Number: CL03C330JB3NNNC; Manufacturer: Samsung Electro-Mechanics America, Inc.; TemperatureRange: -55C ~ 125C; TemperatureCoefficient: C0G, NP0; Tolerance: 5%; Value: 33pF; PartId: 21038; Supplier 1: Digi-Key; Supplier Part Number 1: 1276-6740-2-ND; ComponentLink1Description: Datasheet; ComponentLink1URL: //media.digikey.com/pdf/Data%20Sheets/Samsung%20PDFs/CL_Series_MLCC_ds.pdf; ComponentLink2Description: Digi-Key Listing; ComponentLink2URL: https://www.digikey.com/product-detail/en/samsung-electro-mechanics-america-inc/CL03C330JB3NNNC/1276-6740-2-ND/5961224; Voltage: 50V; Price: 0.012; Device Package: 0201 (0603 Metric)
footprint CAP 0201/0603
pins: 1, 2

## CL03C390JA3NNNC
designator C?, comment 39pF